# Altium integrated library MAXIM.IntLib: 129 symbols
Pins are listed as number, name and electrical type; pins without a type are passive.

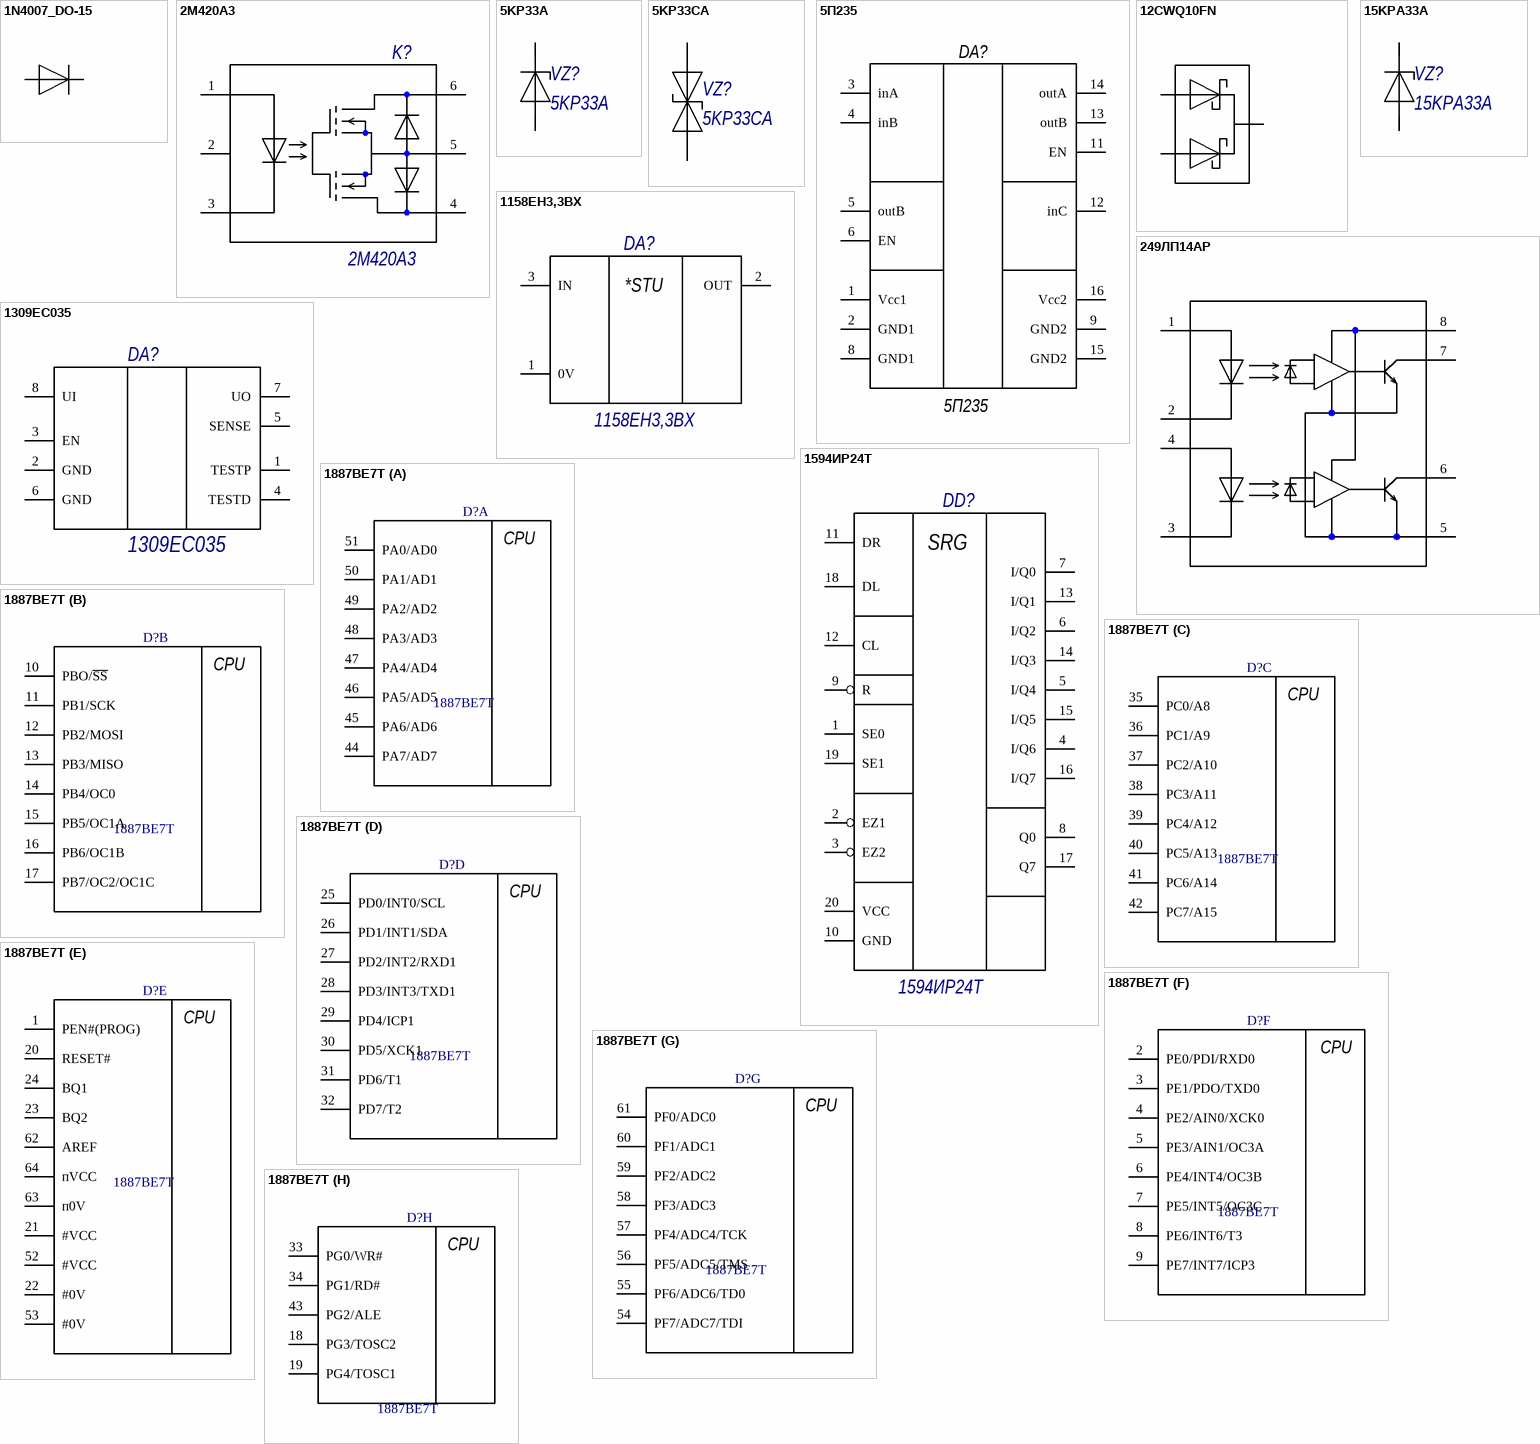
[diagram p0: symbols 1N4007_DO-15 to 1887ВЕ7Т]

## 1N4007_DO-15
designator VD?
1N4007; Alias: *
footprint DO-15
pins: 1, 2

## 2M420A3
designator K?
Оптореле 2M420A3; Manufacturer: Протон-Орел; Voltage: 90В; Current: 5А; Note: АЕЯР.432170.564 ТУ; Alias: *
footprint 2М420А3 (Герметичное МОП-реле 90В/5А)
pins: 1, 2, 3, 4, 5, 6

## 5KP33A
designator VZ?
TVS Диод однонаправленный P600B; Voltage: 36,9...40,4; Alias: *
footprint P600 (TVS_DIODE_P600B)
pins: 1, 2

## 5KP33CA
designator VZ?
TVS Диод двунаправленный P600B; Tolerance: 5%; Alias: *
footprint P600BI (TVS_DIODE_P600B)
pins: 1, 2

## 5П235
designator DA?
изолятор интерфейсов; Alias: *
footprint 4112.16-1
pins: 1 Vcc1, 2 GND1, 3 inA, 4 inB, 5 outB, 6 EN, 8 GND1, 9 GND2, 11 EN, 12 inC, 13 outB, 14 outA, 15 GND2, 16 Vcc2

## 12CWQ10FN
designator VD?  (value not drawn)
Alias: *
footprint DPAK
pins: 1, 3, 4

## 15KPA33A
designator VZ?
TVS Диод однонаправленный P600B; Alias: *
footprint P600 (TVS_DIODE_P600B)
pins: 1, 2

## 249ЛП14АР
designator DA?
многоканальные оптроны; Alias: *
footprint 249ЛП14АР (многоканальные оптроны)
pins: 1, 2, 3, 4, 5 OV, 6, 7, 8 Vcc

## 1158ЕН3,3ВХ
designator DA?
Линейные стабилизаторы с фиксированным выходным напряжением / положительной полярностиаеяр.431420.773 тУ; Alias: *
footprint КТ-93-1
pins: 1 0V, 2 OUT, 3 IN
text: *STU

## 1309EC035
designator DA?
Alias: *
footprint H02.8-1В
pins: 1 TESTP, 2 GND, 3 EN, 4 TESTD, 5 SENSE, 6 GND, 7 UO, 8 UI

## 1594ИР24Т
designator DD?
Восьмиразрядный двунаправленный сдвиговый регистр с / параллельным вводом-выводом, последовательным вводом / информации, асинхронным сбросом и тремя состояниями на / выходе; Alias: *
footprint 4153.20-6_SOW20 (Регистр сдвига)
pins: 1 SE0, 2 EZ1, 3 EZ2, 4 I/Q6, 5 I/Q4, 6 I/Q2, 7 I/Q0, 8 Q0, 9 R, 10 GND, 11 DR, 12 CL, 13 I/Q1, 14 I/Q3, 15 I/Q5, 16 I/Q7, 17 Q7, 18 DL, 19 SE1, 20 VCC
text: SRG

## 1887ВЕ7Т
designator D?
Alias: *
footprint 4203.64-2/CQFP64
part A pins: 44 PA7/AD7, 45 PA6/AD6, 46 PA5/AD5, 47 PA4/AD4, 48 PA3/AD3, 49 PA2/AD2, 50 PA1/AD1, 51 PA0/AD0
part B pins: 10 PBO/~{SS}, 11 PB1/SCK, 12 PB2/MOSI, 13 PB3/MISO, 14 PB4/OC0, 15 PB5/OC1A, 16 PB6/OC1B, 17 PB7/OC2/OC1C
part C pins: 35 PC0/A8, 36 PC1/A9, 37 PC2/A10, 38 PC3/A11, 39 PC4/A12, 40 PC5/A13, 41 PC6/A14, 42 PC7/A15
part D pins: 25 PD0/INT0/SCL, 26 PD1/INT1/SDA, 27 PD2/INT2/RXD1, 28 PD3/INT3/TXD1, 29 PD4/ICP1, 30 PD5/XCK1, 31 PD6/T1, 32 PD7/T2
part E pins: 1 PEN#(PROG), 20 RESET#, 21 #VCC, 22 #0V, 23 BQ2, 24 BQ1, 52 #VCC, 53 #0V, 62 AREF, 63 п0V, 64 пVCC
part F pins: 2 PE0/PDI/RXD0, 3 PE1/PDO/TXD0, 4 PE2/AIN0/XCK0, 5 PE3/AIN1/OC3A, 6 PE4/INT4/OC3B, 7 PE5/INT5/OC3C, 8 PE6/INT6/T3, 9 PE7/INT7/ICP3
part G pins: 54 PF7/ADC7/TDI, 55 PF6/ADC6/TD0, 56 PF5/ADC5/TMS, 57 PF4/ADC4/TCK, 58 PF3/ADC3, 59 PF2/ADC2, 60 PF1/ADC1, 61 PF0/ADC0
part H pins: 18 PG3/TOSC2, 19 PG4/TOSC1, 33 PG0/WR#, 34 PG1/RD#, 43 PG2/ALE
part A text: CPU
part B text: CPU
part C text: CPU
part D text: CPU
part E text: CPU
part F text: CPU
part G text: CPU
part H text: CPU

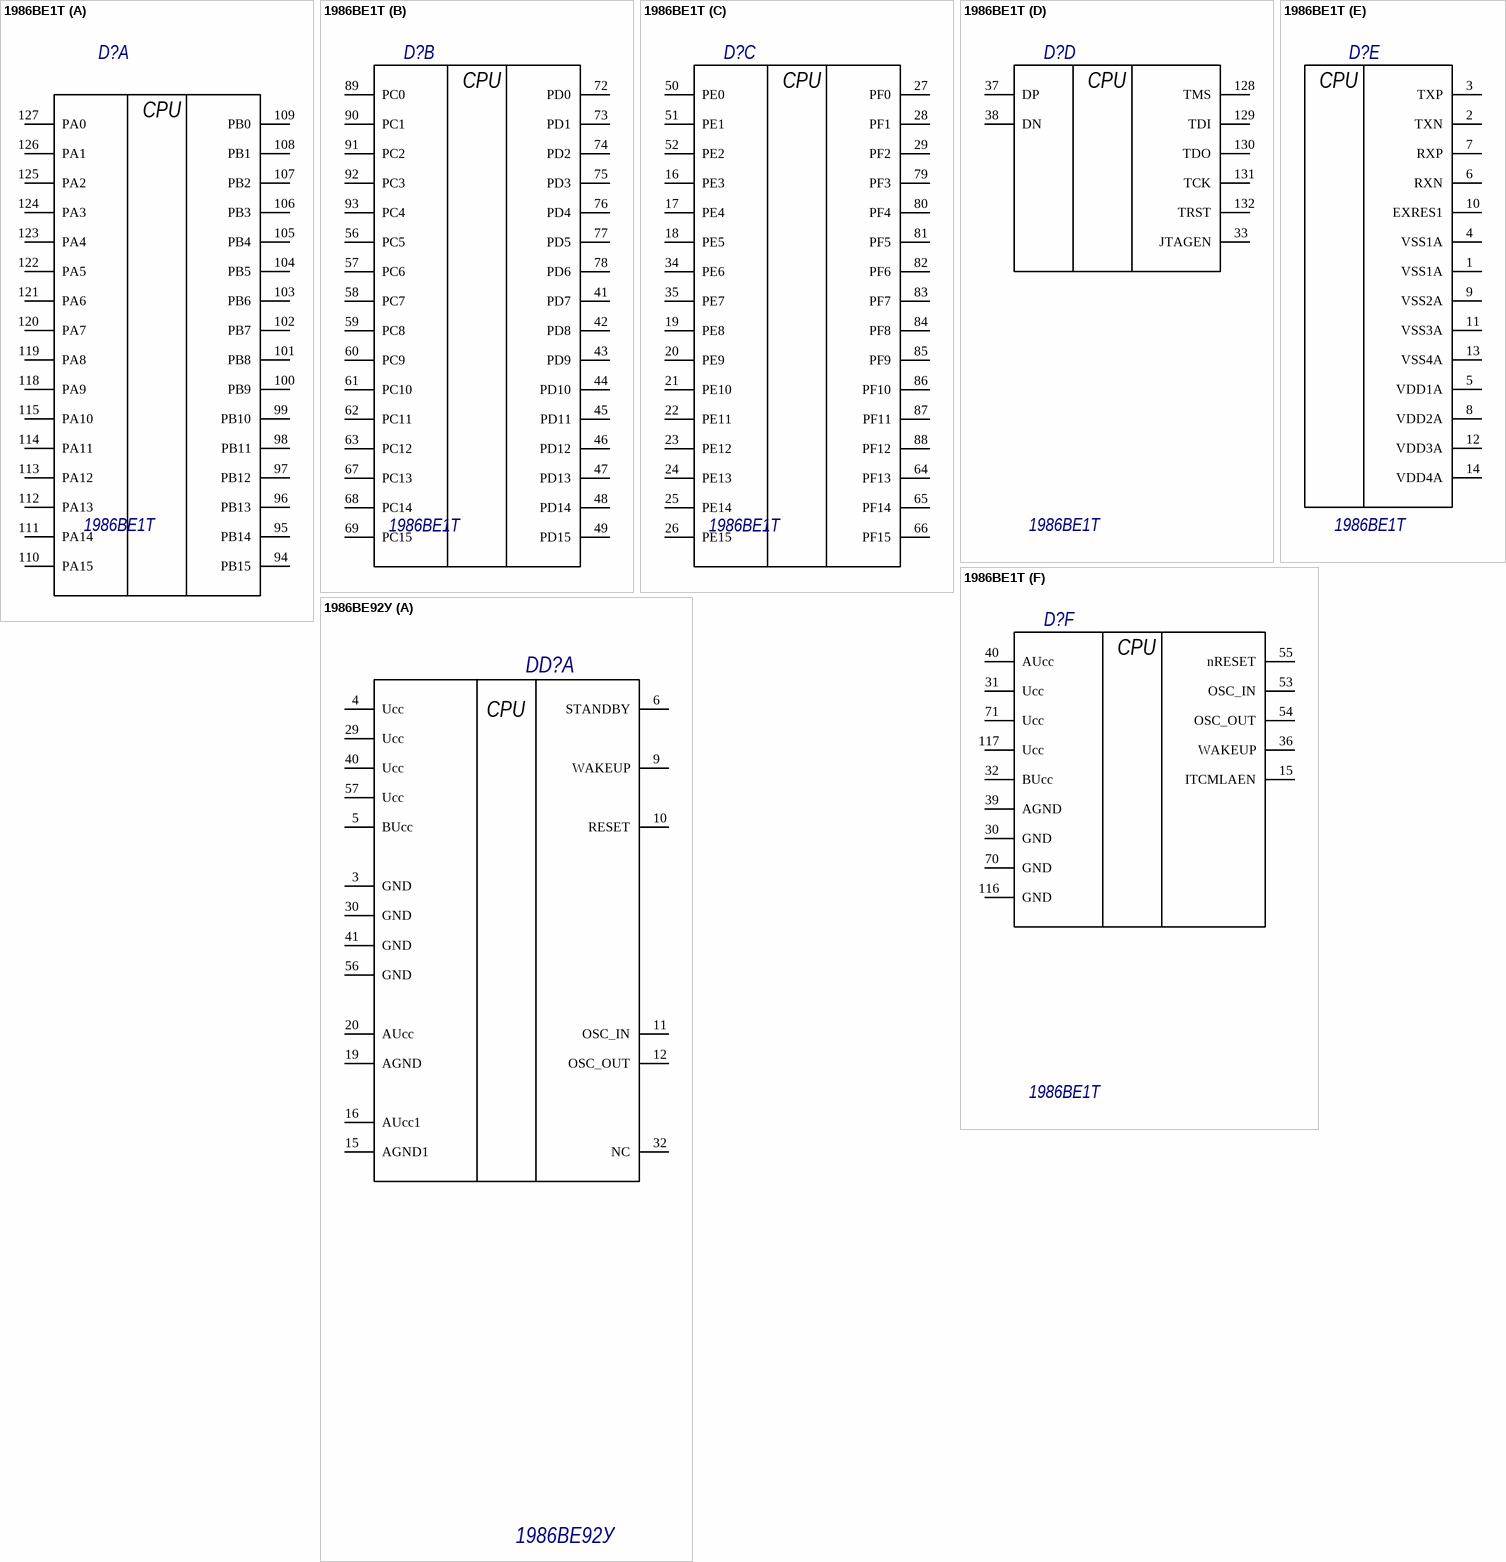
[diagram p1: symbols 1986ВЕ1Т to 1986ВЕ92У]

## 1986ВЕ1Т
designator D?
Микроконтроллер; Alias: *
footprint 4229.132-3
part A pins: 94 PB15, 95 PB14, 96 PB13, 97 PB12, 98 PB11, 99 PB10, 100 PB9, 101 PB8, 102 PB7, 103 PB6, 104 PB5, 105 PB4, 106 PB3, 107 PB2, 108 PB1, 109 PB0, 110 PA15, 111 PA14, 112 PA13, 113 PA12, 114 PA11, 115 PA10, 118 PA9, 119 PA8, 120 PA7, 121 PA6, 122 PA5, 123 PA4, 124 PA3, 125 PA2, 126 PA1, 127 PA0
part B pins: 41 PD7, 42 PD8, 43 PD9, 44 PD10, 45 PD11, 46 PD12, 47 PD13, 48 PD14, 49 PD15, 56 PC5, 57 PC6, 58 PC7, 59 PC8, 60 PC9, 61 PC10, 62 PC11, 63 PC12, 67 PC13, 68 PC14, 69 PC15, 72 PD0, 73 PD1, 74 PD2, 75 PD3, 76 PD4, 77 PD5, 78 PD6, 89 PC0, 90 PC1, 91 PC2, 92 PC3, 93 PC4
part C pins: 16 PE3, 17 PE4, 18 PE5, 19 PE8, 20 PE9, 21 PE10, 22 PE11, 23 PE12, 24 PE13, 25 PE14, 26 PE15, 27 PF0, 28 PF1, 29 PF2, 34 PE6, 35 PE7, 50 PE0, 51 PE1, 52 PE2, 64 PF13, 65 PF14, 66 PF15, 79 PF3, 80 PF4, 81 PF5, 82 PF6, 83 PF7, 84 PF8, 85 PF9, 86 PF10, 87 PF11, 88 PF12
part D pins: 33 JTAGEN, 37 DP, 38 DN, 128 TMS, 129 TDI, 130 TDO, 131 TCK, 132 TRST
part E pins: 1 VSS1A, 2 TXN, 3 TXP, 4 VSS1A, 5 VDD1A, 6 RXN, 7 RXP, 8 VDD2A, 9 VSS2A, 10 EXRES1, 11 VSS3A, 12 VDD3A, 13 VSS4A, 14 VDD4A
part F pins: 15 ITCMLAEN, 30 GND, 31 Ucc, 32 BUcc, 36 WAKEUP, 39 AGND, 40 AUcc, 53 OSC_IN, 54 OSC_OUT, 55 nRESET, 70 GND, 71 Ucc, 116 GND, 117 Ucc
part A text: CPU
part B text: CPU
part C text: CPU
part D text: CPU
part E text: CPU
part F text: CPU

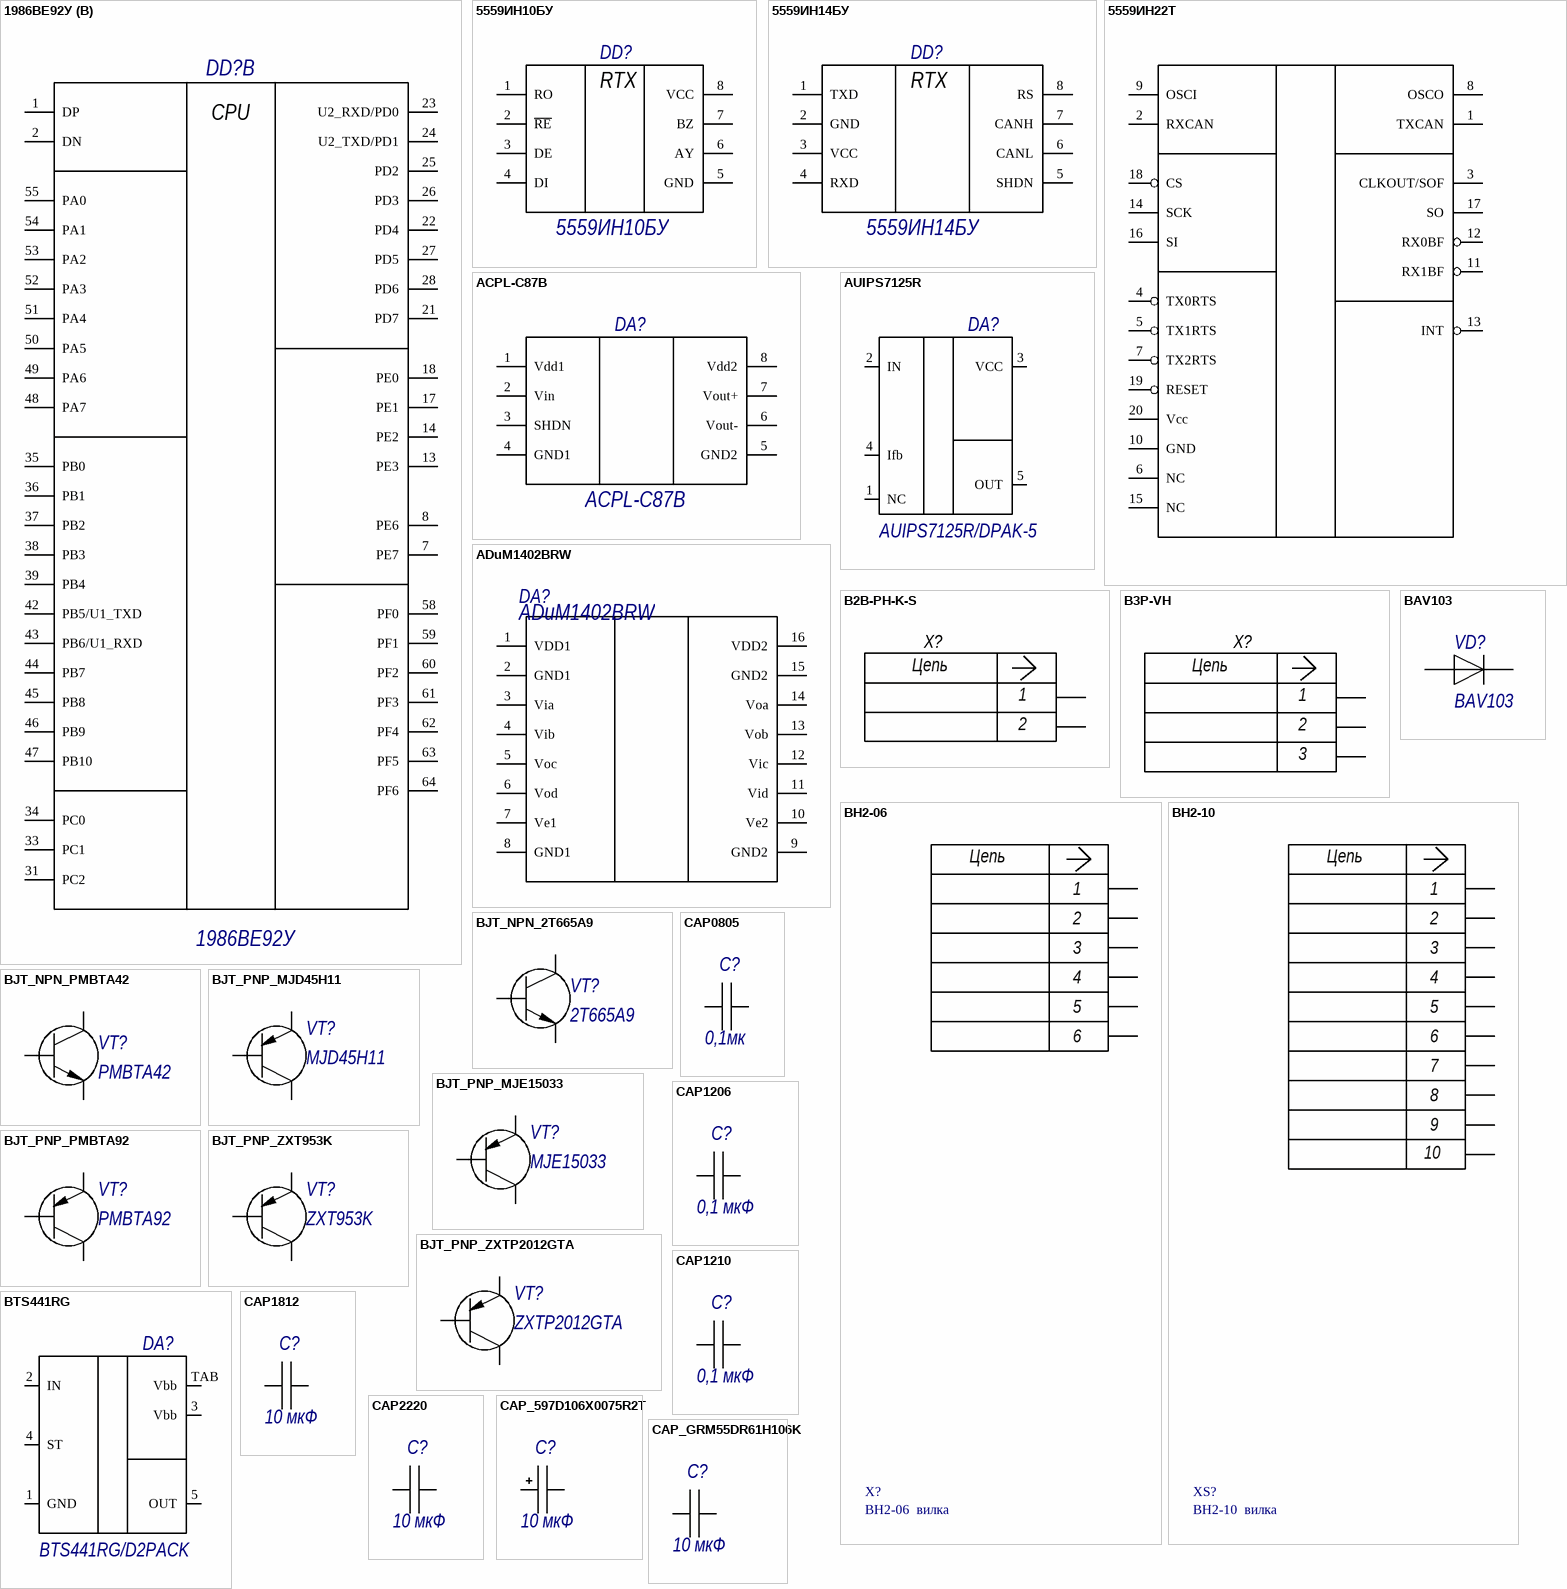
[diagram p2: symbols 1986ВЕ92У to CAP_GRM55DR61H106K]

## 1986ВЕ92У
designator DD?
Alias: *
footprint H18.64-1В
part A pins: 3 GND, 4 Ucc, 5 BUcc, 6 STANDBY, 9 WAKEUP, 10 RESET, 11 OSC_IN, 12 OSC_OUT, 15 AGND1, 16 AUcc1, 19 AGND, 20 AUcc, 29 Ucc, 30 GND, 32 NC, 40 Ucc, 41 GND, 56 GND, 57 Ucc
part B pins: 1 DP, 2 DN, 7 PE7, 8 PE6, 13 PE3, 14 PE2, 17 PE1, 18 PE0, 21 PD7, 22 PD4, 23 U2_RXD/PD0, 24 U2_TXD/PD1, 25 PD2, 26 PD3, 27 PD5, 28 PD6, 31 PC2, 33 PC1, 34 PC0, 35 PB0, 36 PB1, 37 PB2, 38 PB3, 39 PB4, 42 PB5/U1_TXD, 43 PB6/U1_RXD, 44 PB7, 45 PB8, 46 PB9, 47 PB10, 48 PA7, 49 PA6, 50 PA5, 51 PA4, 52 PA3, 53 PA2, 54 PA1, 55 PA0, 58 PF0, 59 PF1, 60 PF2, 61 PF3, 62 PF4, 63 PF5, 64 PF6
part A text: CPU
part B text: CPU

## 5559ИН10БУ
designator DD?
Alias: *
footprint SO8 (SOIC, 8-Leads, Body 4.9x3.9mm, Pitch 1.27mm, IPC Medium Density)
footprint H02.8-1В
pins: 1 RO, 2 ~{RE}, 3 DE, 4 DI, 5 GND, 6 AY, 7 BZ, 8 VCC
text: RTX

## 5559ИН14БУ
designator DD?
Alias: *
footprint SO8 (SOIC, 8-Leads, Body 4.9x3.9mm, Pitch 1.27mm, IPC Medium Density)
footprint H02.8-1В
pins: 1 TXD, 2 GND, 3 VCC, 4 RXD, 5 SHDN, 6 CANL, 7 CANH, 8 RS
text: RTX

## 5559ИН22Т
designator DA?
Alias: *
footprint 5559ИН22Т (Автономный CAN - контроллер)
pins: 1 TXCAN, 2 RXCAN, 3 CLKOUT/SOF, 4 TX0RTS, 5 TX1RTS, 6 NC, 7 TX2RTS, 8 OSCO, 9 OSCI, 10 GND, 11 RX1BF, 12 RX0BF, 13 INT, 14 SCK, 15 NC, 16 SI, 17 SO, 18 CS, 19 RESET, 20 Vcc

## ACPL-C87B
designator DA?
Alias: *
footprint SSO-8
pins: 1 Vdd1, 2 Vin, 3 SHDN, 4 GND1, 5 GND2, 6 Vout-, 7 Vout+, 8 Vdd2

## ADuM1402BRW
designator DA?
Alias: *
footprint SOIC-16
pins: 1 VDD1, 2 GND1, 3 Via, 4 Vib, 5 Voc, 6 Vod, 7 Ve1, 8 GND1, 9 GND2, 10 Ve2, 11 Vid, 12 Vic, 13 Vob, 14 Voa, 15 GND2, 16 VDD2

## AUIPS7125R
designator DA?, comment AUIPS7125R/DPAK-5
CURRENT SENSE HIGH SIDE SWITCH 65V 3.8A; Manufacturer: IRF/INFINION; Power: 2.5Вт; Value: 0.03 Ом; Voltage: 65В; Current: 3.8А; Alias: *; ComponentLink3Description: New link; ComponentLink3URL: https://www.infineon.com/dgdl/auips7125.pdf?fileId=5546d462533600a4015355a7d96a132a
footprint TO-252-4L (D-PAK, 5-Pads, Body 6,21x6,72mm (max), IPC Medium Density)
pins: 1 NC, 2 IN, 3 VCC, 4 Ifb, 5 OUT

## B2B-PH-K-S
designator X?
B2B-PH-K-S; Alias: *
footprint B2B-PH-K-S
pins: 1, 2
text: Цепь

## B3P-VH
designator X?  (value not drawn)
Alias: *
footprint B3P-VH
pins: 1, 2, 3
text: Цепь

## BAV103
designator VD?
Диод 200 В, 200 мА, 1.25 В, 50 нс [SOD-80 / Mini-MELF]; Tolerance: 5%; Alias: *
footprint SOD-80
pins: 1, 2

## BH2-06
designator X?, comment BH2-06  вилка
BH2-06  вилка   шаг 2; Alias: *
footprint BH2-06
pins: 1, 2, 3, 4, 5, 6
text: Цепь

## BH2-10
designator XS?, comment BH2-10  вилка
BH2-10  вилка шаг 2; Alias: *
footprint BH2-10
pins: 1, 2, 3, 4, 5, 6, 7, 8, 9, 10
text: Цепь

## BJT_NPN_2Т665А9
designator VT?, comment 2Т665А9
Биполярный транзистор NPN, 80 В, 1 Вт, 1 А, 40 hFE [SOT-89]; Manufacturer: Кремний эл; Power: 1Вт; Voltage: 80В; Current: 1А; Alias: *
footprint SOT-89-150P410X160-3N (SOT89, 3-Leads, Body 4,50x2,45mm, Pitch 1,50mm, Lead Span 4,1mm, IPC Medium Density)
pins: 1, 2, 3

## BJT_NPN_PMBTA42
designator VT?, comment PMBTA42
Биполярный транзистор NPN, 300 В, 250 мВт, 100 мА, 40 hFE [SOT-23]; Manufacturer: NXP/Neperia; Power: 0.25Вт; Voltage: 300В; Current: 0.1А; Alias: *
footprint SOT-23-3
pins: 1, 2, 3

## BJT_PNP_MJD45H11
designator VT?, comment MJD45H11
Manufacturer: ON SEMI; Power: 2Вт; Voltage: 250В; Current: 8А; Alias: *
footprint TO-252_DPAK (Complementary PowerTransistors)
pins: 1 B, 3 E, 4 C

## BJT_PNP_MJE15033
designator VT?, comment MJE15033
Manufacturer: ON SEMI; Power: 2Вт; Voltage: 250В; Current: 8А; Alias: *
footprint TO-220 (TO220)
pins: 1 B, 2 C, 3 E

## BJT_PNP_PMBTA92
designator VT?, comment PMBTA92
Биполярный транзистор PNP, 300 В, 100 мА, 0.25 Вт SOT-23 (TO-236AB),; Manufacturer: NXP/Neperia; Power: 0.25Вт; Voltage: 300В; Current: 0.1А; Alias: *
footprint SOT-23-3
pins: 1, 2, 3

## BJT_PNP_ZXT953K
designator VT?, comment ZXT953K
100V 5A PNP LOW SATURATION MEDIUM POWER TRANSISTOR; Manufacturer: Diodes; Power: 2Вт; Voltage: 100В; Current: 5А; Note: LOW SATURATION; Alias: *
footprint TO-252_DPAK (Complementary PowerTransistors)
pins: 1 B, 3 E, 4 C

## BJT_PNP_ZXTP2012GTA
designator VT?, comment ZXTP2012GTA
60V 5.5A PNP MEDIUM POWER LOW SATURATION TRANSISTOR IN SOT223; Manufacturer: DIODES; Power: 1.6Вт; Voltage: 60В; Current: 5.5А; Note: LOW SAT; Alias: *
footprint SOT-223 (SOT223, 4-Leads, Body 6,50x7,00mm (avg), Pitch 2,30mm, IPC Medium Density)
pins: 1 B, 2 C, 3 E

## BTS441RG
designator DA?, comment BTS441RG/D2PACK
BTS441RG; Tolerance: 5%; Alias: *
footprint D2PAK-5
pins: 1 GND, 2 IN, 3 Vbb, 4 ST, 5 OUT, TAB Vbb

## CAP0805
designator C?, comment 0,1мк
Керамический ЧИП конденсатор 0.1 мкФ X7R 50В 10% 0805, GRM21BR71H104K; Tolerance: 10%; Alias: *
footprint cap0805
pins: 1, 2

## CAP1206
designator C?, comment 0,1 мкФ
Керамический ЧИП конденсатор 0.1 мкФ X7R 50В 10% 1206, GRM319R71H104K; Tolerance: 10%; Alias: *
footprint cap1206
pins: 1, 2

## CAP1210
designator C?, comment 0,1 мкФ
Керамический ЧИП конденсатор 0.1 мкФ X7R 250В 10% 1210, GRM32DR72E104K; Tolerance: 10%; Alias: *
footprint cap1210
pins: 1, 2

## CAP1812
designator C?, comment 10 мкФ
Керамический ЧИП конденсатор 0.1 мкФ X7R 250В 10% 1812, GRM43; Tolerance: 10%; Alias: *
footprint CAP1812
pins: 1, 2

## CAP2220
designator C?, comment 10 мкФ
Керамический ЧИП конденсатор 10мкФ X5R 50В 10% 2220, GRM55DR61H106K; Tolerance: 10%; Alias: *
footprint CAP2220 (Chip Monolithic Ceramic Capacitors general application 2220)
pins: 1, 2

## CAP_597D106X0075R2T
designator C?, comment 10 мкФ
Танталовый конденсатор 10мкФ  75В 10% , 597D106X0075R2T VISHAY; Tolerance: 10%; Alias: *
footprint CAP_TANT-597D_CASE_R
pins: 1, 2

## CAP_GRM55DR61H106K
designator C?, comment 10 мкФ
Керамический ЧИП конденсатор 10мкФ X5R 50В 10% 2220, GRM55DR61H106K; Tolerance: 10%; Alias: *
footprint CAP2220 (Chip Monolithic Ceramic Capacitors general application 2220)
pins: 1, 2

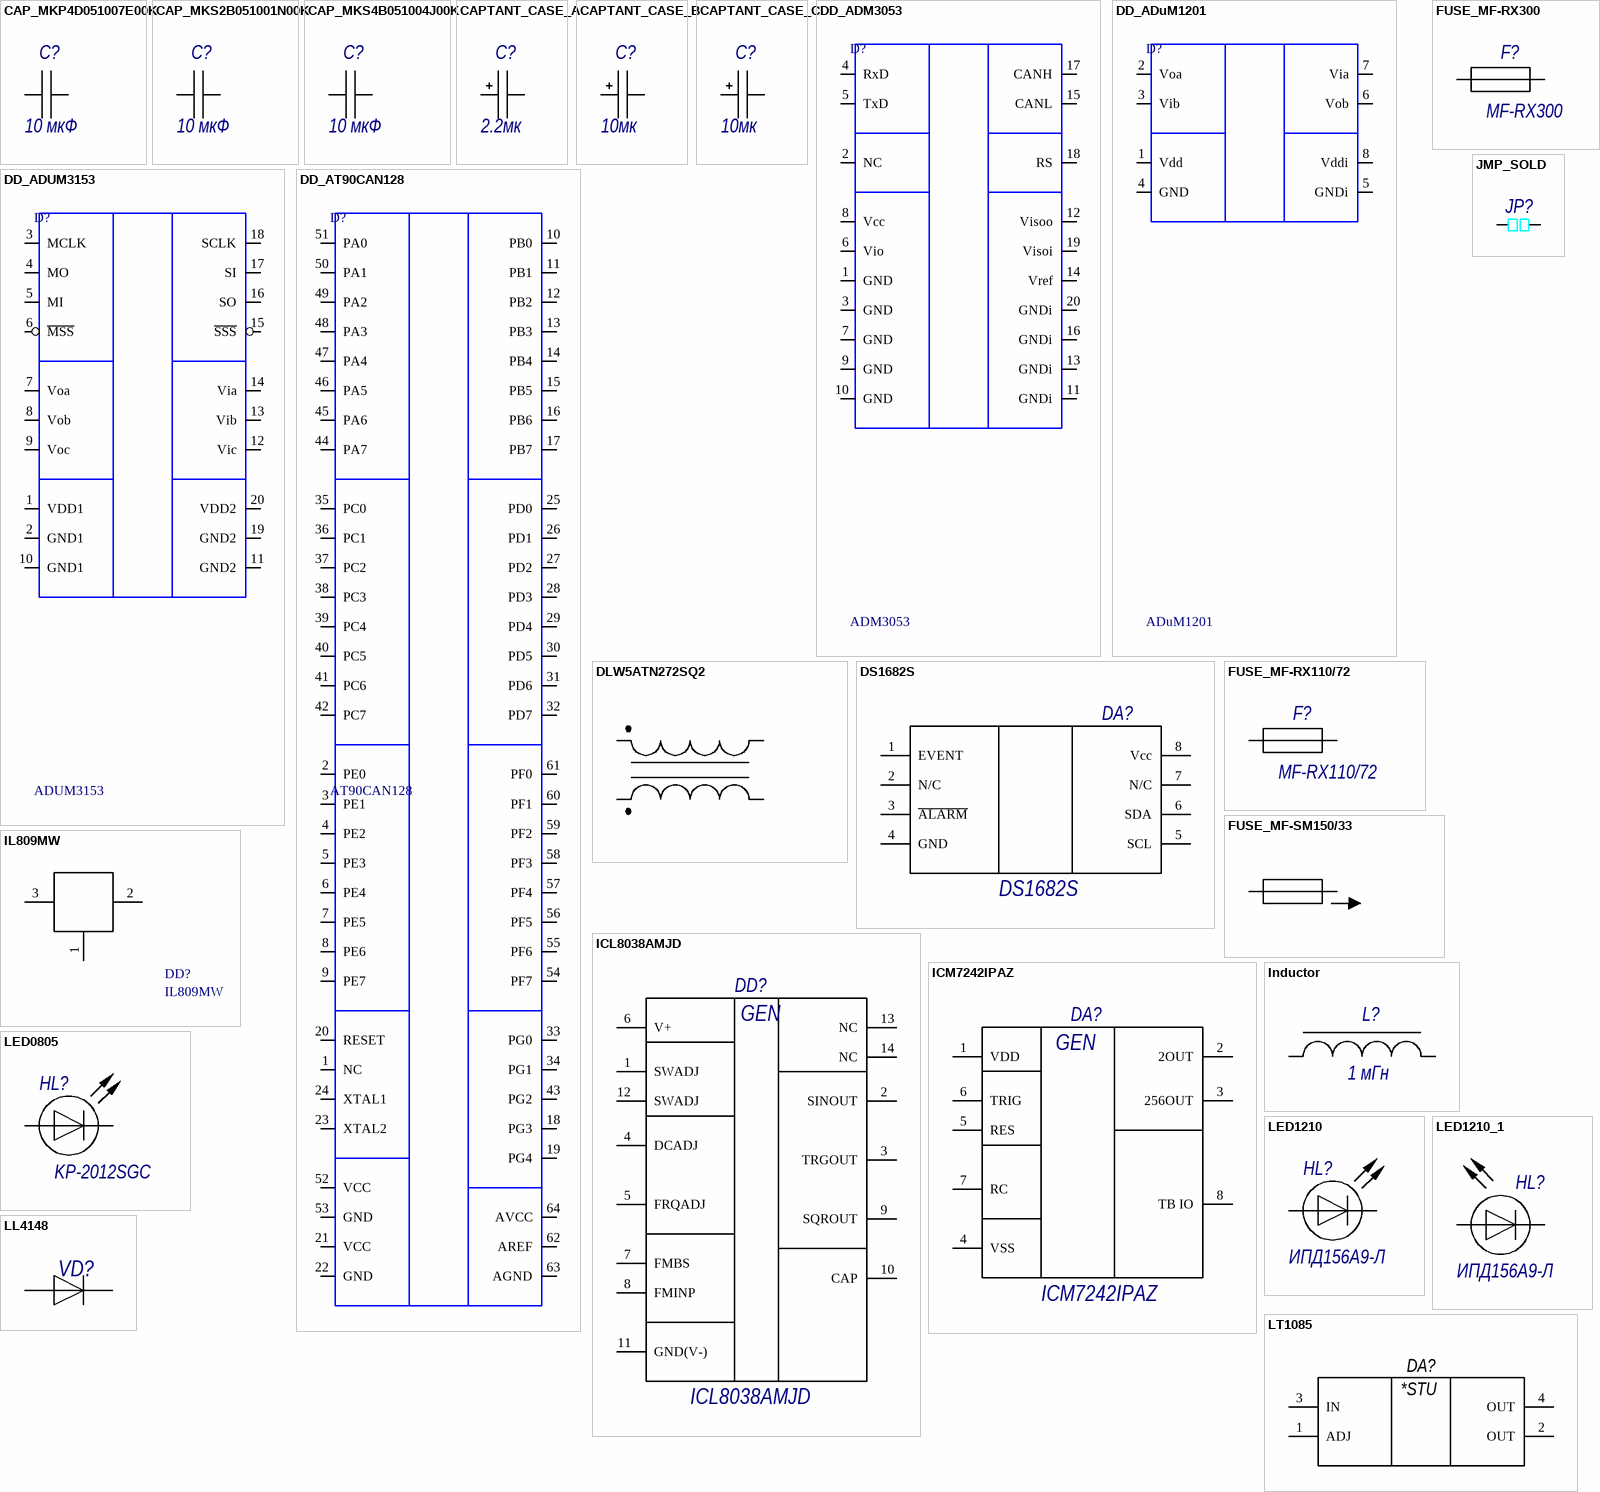
[diagram p3: symbols CAP_MKP4D051007E00K to LT1085]

## CAP_MKP4D051007E00K
designator C?, comment 10 мкФ
Пленочный конденсатор 10мкФ MKP 100В 10% PCM=37.5мм, MKP4D051007E00K WIMA; Tolerance: 5%; Alias: *
footprint CAP_MKP4_PCM37.5 (FILM CAP WIMA)
pins: 1, 2

## CAP_MKS2B051001N00K
designator C?, comment 10 мкФ
Пленочный конденсатор 10мкФ MKS 50В 10% PCM=5мм, MKS2B051001N00K WIMA; Tolerance: 5%; Alias: *
pins: 1, 2
